# Altium footprint library 2016AbbasBasereh9365731239.PcbLib: 204 footprints (part 12 of 13)
Each footprint in its own frame and in the unit in brackets; x right, y up, seen from the top. Pads: shape width x height; smd on the part's side, far side on the other; paste and mask are expansions set on the pad; w line width, h text height; cw(c..) or ccw(c..) is an arc to the next point about the centre after c.
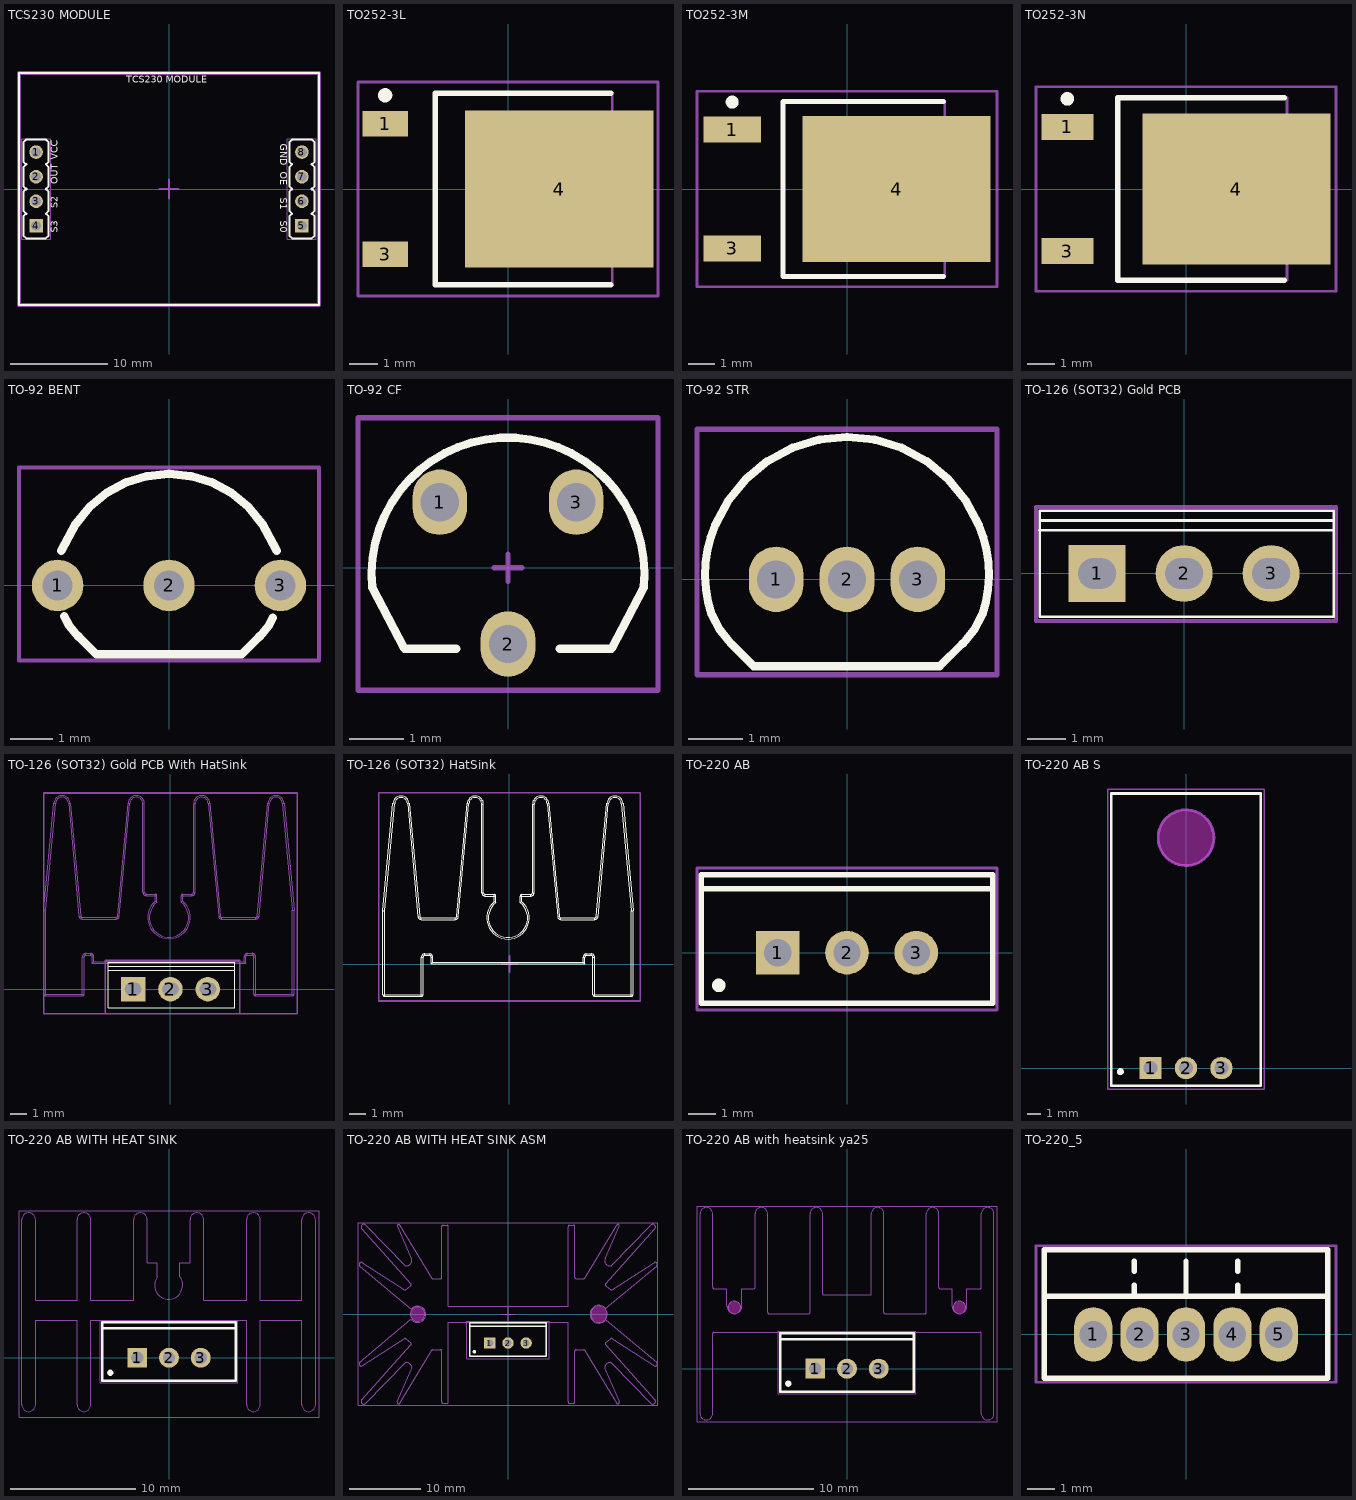
[diagram p11: the footprints below, top view; thin cyan lines are the x and y axes]

## TCS230 MODULE [mm] "DESIGNER ABBAS BASEREH"
height 1.4
pads (8):
  round 1.4 / inner round 1.4 / far side oval 2.2x1.4 hole 1 mask+0.1: 1(-13.737,3.81) 2(-13.737,1.27) 3(-13.737,-1.27) 6(13.738,-1.27) 7(13.738,1.27) 8(13.738,3.81)
  rect 1.4x1.4 / inner rect 1.4x1.4 / far side rect 2.2x1.4 hole 1 mask+0.1: 4(-13.737,-3.81) 5(13.738,-3.81)
Top Overlay:
  lines w0.2: -14.737,-2.57 -15.037,-2.27 -15.037,-0.27 -14.737,0.03 ; -14.737,-2.51 -15.037,-2.81 -15.037,-4.81 -14.737,-5.11 -12.737,-5.11 -12.437,-4.81 -12.437,-2.81 -12.737,-2.51 ; -14.737,-0.03 -15.037,0.27 -15.037,2.27 -14.737,2.57 ; -14.737,2.515 -15.037,2.815 -15.037,4.815 -14.737,5.115 -12.737,5.115 -12.437,4.815 -12.437,2.815 -12.737,2.515 ; -12.737,-2.57 -12.437,-2.27 -12.437,-0.27 -12.737,0.03 ; -12.737,-0.03 -12.437,0.27 -12.437,2.27 -12.737,2.57 ; 12.738,-2.57 12.438,-2.27 12.438,-0.27 12.738,0.03 ; 12.738,-2.51 12.438,-2.81 12.438,-4.81 12.738,-5.11 14.738,-5.11 15.038,-4.81 15.038,-2.81 14.738,-2.51 ; 12.738,-0.03 12.438,0.27 12.438,2.27 12.738,2.57 ; 12.738,2.515 12.438,2.815 12.438,4.815 12.738,5.115 14.738,5.115 15.038,4.815 15.038,2.815 14.738,2.515 ; 14.738,-2.57 15.038,-2.27 15.038,-0.27 14.738,0.03 ; 14.738,-0.03 15.038,0.27 15.038,2.27 14.738,2.57 ; -15.5,-12 -15.5,12 15.5,12 15.5,-12 -15.5,-12
  text "S0" at 11.5,-3.3 h0.7
  text "S1" at 11.5,-0.9 h0.7
  text "OE" at 11.5,1.8 h0.7
  text "GND" at 11.5,4.7 h0.7
  text "S3" at -11.5,-4.5 h0.7
  text "S2" at -11.5,-2 h0.7
  text "OUT" at -11.5,0.5 h0.7
  text "VCC" at -11.5,3 h0.7
  text "TCS230 MODULE" at -4.4,11 h0.7
Mechanical 15:
  lines w0.1: -15.237,-5.21 -12.237,-5.21 -12.237,5.215 -15.237,5.215 -15.237,-5.21 ; 12.238,-5.21 12.238,5.215 15.238,5.215 15.238,-5.21 12.238,-5.21
  lines w0.2: -1,0 1,0 ; 0,-1 0,1
  lines w0.4: -15.5,-12 -15.5,12 15.5,12 15.5,-12 -15.5,-12
3D body "User Library-Header_Male_4Pin.STEP": height 8.54, standoff -3, extent 12.468,-5.08 14.957,5.08
3D body "User Library-Header_Male_4Pin.STEP": height 8.54, standoff -3, extent -15.007,-5.08 -12.518,5.08

## TO252-3L [mm] "D-PAK, 3-Pads, Body 6.2x6.7mm (max), IPC High Density"
height 2.38
pads (3):
  rect 1.6x0.9 smd: 1(-4.3,2.28) 3(-4.3,-2.28)
  rect 6.6x5.5 smd: 4(1.8,0)
Top Overlay:
  circle w0.25: c-4.3,3.28 r0.125
  lines w0.2: 3.6,-3.35 -2.55,-3.35 -2.55,3.35 3.6,3.35
Mechanical 13:
  lines w0.1: -2.55,-3.35 -2.55,3.35 3.65,3.35 3.65,-3.35 -2.55,-3.35
Mechanical 15:
  lines w0.1: -0.5,0 0.5,0 ; 0,-0.5 0,0.5 ; -5.25,-3.75 -5.25,3.75 5.25,3.75 5.25,-3.75 -5.25,-3.75
3D body "User Library-DPAK-1.step": height 2.39, standoff -0.02, extent -5.061,-3.27 4.878,3.27

## TO252-3M [mm] "D-PAK, 3-Pads, Body 6.2x6.7mm (max), IPC Low Density"
height 2.38
pads (3):
  rect 2.2x1 smd: 1(-4.4,2.28) 3(-4.4,-2.28)
  rect 7.2x5.6 smd: 4(1.9,0)
Top Overlay:
  circle w0.25: c-4.4,3.33 r0.125
  lines w0.2: 3.7,-3.35 -2.45,-3.35 -2.45,3.35 3.7,3.35
Mechanical 13:
  lines w0.1: -2.45,-3.35 3.75,-3.35 3.75,3.35 -2.45,3.35 -2.45,-3.35
Mechanical 15:
  lines w0.1: -0.5,0 0.5,0 ; 0,-0.5 0,0.5 ; -5.75,-3.75 -5.75,3.75 5.75,3.75 5.75,-3.75 -5.75,-3.75
3D body "User Library-DPAK-1.step": height 2.39, standoff -0.02, extent -5.061,-3.27 4.878,3.27

## TO252-3N [mm] "D-PAK, 3-Pads, Body 6.2x6.7mm (max), IPC Medium Density"
height 2.38
pads (3):
  rect 1.9x0.95 smd: 1(-4.35,2.28) 3(-4.35,-2.28)
  rect 6.9x5.55 smd: 4(1.85,0)
Top Overlay:
  circle w0.25: c-4.35,3.305 r0.125
  lines w0.2: 3.6,-3.35 -2.5,-3.35 -2.5,3.35 3.6,3.35
Mechanical 13:
  lines w0.1: -2.5,-3.35 3.7,-3.35 3.7,3.35 -2.5,3.35 -2.5,-3.35
Mechanical 15:
  lines w0.1: -0.5,0 0.5,0 ; 0,-0.5 0,0.5 ; -5.5,-3.75 5.5,-3.75 5.5,3.75 -5.5,3.75 -5.5,-3.75
3D body "User Library-DPAK-1.step": height 2.39, standoff -0.02, extent -5.061,-3.27 4.878,3.27

## TO-92 BENT [mm] "DESIGNER :ABBAS BASEREH"
height 8
pads (3):
  round 1.2 hole 0.7: 1(-2.6,0) 2(0,0) 3(2.6,0)
Top Overlay:
  lines w0.2: -2.512,0.806 -2.173,1.441 -1.848,1.837 -1.452,2.162 -1,2.403 -0.51,2.552 0,2.602 0.51,2.552 1,2.403 1.452,2.162 1.848,1.837 2.173,1.441 2.512,0.806 ; -2.443,-0.723 -2.326,-0.941 -2.118,-1.195 -2.112,-1.189 -1.7,-1.601 1.7,-1.601 2.112,-1.189 2.118,-1.195 2.326,-0.941 2.424,-0.759
Mechanical 15:
  lines w0.1: -3.5,-1.75 3.5,-1.75 3.5,2.75 -3.5,2.75 -3.5,-1.75
3D body "User Library-TO-92_Bent.STEP": height 10, standoff -3, extent -2.79,-1.59 2.79,2.613

## TO-92 CF [mm] "DESIGNER :ABBAS BASEREH"
height 8.5
pads (3):
  oval 1x1.2 hole 0.7: 1(-1.25,1.2) 2(0,-1.4) 3(1.25,1.2)
Top Overlay:
  lines w0.15: -0.95,-1.485 -1.9,-1.485 -2.487,-0.365 cw(c0,-0.115) 2.487,-0.365 1.9,-1.485 0.95,-1.485
Mechanical 15:
  lines w0.1: -0.25,0 0.25,0 ; 0,-0.25 0,0.25 ; -2.75,-2.25 2.75,-2.25 2.75,2.75 -2.75,2.75 -2.75,-2.25
3D body "User Library-TO-92_CF127SB127.STEP": height 8.5, standoff -4, extent -2.5,-1.57 2.5,2.4

## TO-92 STR [mm] "DESIGNER :ABBAS BASEREH"
height 7
pads (3):
  oval 1x1.2 hole 0.7 mask+0.06: 1(-1.3,0) 2(0,0) 3(1.3,0)
Top Overlay:
  lines w0.15: -2.481,-0.642 cw(c-0.325,0.092) -2.414,0.999 -2.173,1.45 -1.848,1.846 -1.452,2.171 -1,2.413 -0.51,2.562 0,2.612 0.51,2.562 1,2.413 1.452,2.171 1.848,1.846 2.173,1.45 2.414,0.999 cw(c0.325,0.092) 2.481,-0.642 2.326,-0.931 2.118,-1.185 2.112,-1.18 1.7,-1.592 -1.712,-1.592 -2.118,-1.185 -2.326,-0.931 -2.481,-0.642
Mechanical 15:
  lines w0.1: -2.75,-1.75 2.75,-1.75 2.75,2.75 -2.75,2.75 -2.75,-1.75
3D body "User Library-TO-92_Str.STEP": height 10, standoff -3, extent -2.613,-1.591 2.613,2.613

## TO-126 (SOT32) Gold PCB [mm] "Design:Abbas Basereh"
height 16
pads (3):
  rect 1.5x1.5 hole 0.8 slot 1 at 0 deg: 1(-2.29,0)
  round 1.5 hole 0.8 slot 1 at 0 deg: 2(0,0) 3(2.29,0)
Top Overlay:
  lines w0.07: -3.81,1.143 3.937,1.143 3.937,1.651 ; -3.8,1.397 3.937,1.397 ; 3.937,1.651 -3.8,1.651 -3.8,-1.143 3.937,-1.143 3.937,1.651
Mechanical 15:
  lines w0.1: -3.9,-1.25 -3.9,1.75 4,1.75 4,-1.25 -3.9,-1.25
3D body "User Library-TO-126 (SOT32) Gold PCB.STEP": height 13.19, standoff -3.54, extent -3.8,-1 3.8,1.55

## TO-126 (SOT32) Gold PCB With HatSink [mm] "Design:Abbas Basereh"
height 16
pads (3):
  rect 1.5x1.5 hole 0.8 slot 1 at 0 deg: 1(-2.29,0)
  round 1.5 hole 0.8 slot 1 at 0 deg: 2(0,0) 3(2.29,0)
Top Overlay:
  lines w0.07: -3.81,1.143 3.937,1.143 3.937,1.651 ; -3.8,1.397 3.937,1.397 ; 3.937,1.651 -3.8,1.651 -3.8,-1.143 3.937,-1.143 3.937,1.651
Mechanical 1:
  lines w0.013: -7.74,-0.318 ccw(c-7.64,-0.318) -7.64,-0.418 ; -5.498,4.473 ccw(c-5.399,4.482) -5.399,4.382 ; -5.39,-0.418 ccw(c-5.39,-0.318) -5.29,-0.318 ; -5.29,1.982 cw(c-5.19,1.982) -5.19,2.082 ; -4.89,2.082 cw(c-4.89,1.982) -4.79,1.982 ; -3.327,4.382 ccw(c-3.327,4.482) -3.227,4.473 ; -1.59,5.919 ccw(c-1.49,5.919) -1.49,5.819 ; -0.94,5.819 cw(c-0.94,5.719) -0.84,5.719 ; 0.66,5.719 cw(c0.76,5.719) 0.76,5.819 ; 1.31,5.819 ccw(c1.31,5.919) 1.41,5.919 ; 3.047,4.473 ccw(c3.147,4.482) 3.147,4.382 ; 4.61,1.982 cw(c4.71,1.982) 4.71,2.082 ; 5.01,2.082 cw(c5.01,1.982) 5.11,1.982 ; 5.11,-0.318 ccw(c5.21,-0.318) 5.21,-0.418 ; 5.219,4.382 ccw(c5.219,4.482) 5.318,4.473 ; 7.46,-0.418 ccw(c7.46,-0.318) 7.56,-0.318
  lines w0.05: -7.74,4.832 -7.74,-0.318 -7.64,-0.318 ; -7.74,4.832 -7.64,4.827 ; -7.74,4.832 -7.133,11.388 ; -7.64,-0.318 -5.39,-0.318 ; -7.64,-0.318 -7.64,4.827 ; -7.64,-0.318 -7.64,-0.418 -5.39,-0.418 -5.39,-0.318 ; -7.64,4.827 -7.034,11.379 ; -7.133,11.388 cw(c-6.636,11.342) -6.138,11.388 ; -7.133,11.388 -7.034,11.379 ; -7.034,11.379 cw(c-6.636,11.342) -6.237,11.379 ; -6.237,11.379 -5.598,4.464 ; -6.237,11.379 -6.138,11.388 ; -6.138,11.388 -5.498,4.473 -5.598,4.464 ; -5.598,4.464 ccw(c-5.399,4.482) -5.399,4.282 ; -5.399,4.282 -3.327,4.282 ; -5.399,4.282 -5.399,4.382 -3.327,4.382 -3.327,4.282 ; -5.39,-0.318 -5.39,1.982 ; -5.39,-0.318 -5.29,-0.318 -5.29,1.982 -5.39,1.982 ; -5.39,1.982 cw(c-5.19,1.982) -5.19,2.182 ; -5.19,2.182 -4.89,2.182 ; -5.19,2.182 -5.19,2.082 -4.89,2.082 -4.89,2.182 ; -4.89,2.182 cw(c-4.89,1.982) -4.69,1.982 ; -4.79,1.582 4.61,1.582 ; -4.79,1.582 -4.69,1.682 ; -4.79,1.582 -4.79,1.982 -4.69,1.982 ; -4.69,1.682 4.51,1.682 ; -4.69,1.682 -4.69,1.982 ; -3.327,4.282 ccw(c-3.327,4.482) -3.128,4.464 ; -3.128,4.464 -2.488,11.379 ; -3.128,4.464 -3.227,4.473 -2.588,11.388 ; -2.588,11.388 cw(c-2.09,11.342) -1.59,11.342 ; -2.588,11.388 -2.488,11.379 ; -2.488,11.379 cw(c-2.09,11.342) -1.69,11.342 ; -1.69,5.919 ccw(c-1.49,5.919) -1.49,5.719 ; -1.69,5.919 -1.69,11.342 ; -1.69,5.919 -1.59,5.919 -1.59,11.342 ; -1.69,11.342 -1.59,11.342 ; -1.49,5.719 -0.94,5.719 ; -1.49,5.719 -1.49,5.819 -0.94,5.819 -0.94,5.719 ; -0.94,5.366 cw(c-3.387,0.015) -0.84,5.319 ; -0.94,5.366 ccw(c-0.09,4.382) 0.76,5.366 ; -0.94,5.366 -0.94,5.719 ; -0.94,5.719 -0.84,5.719 -0.84,5.319 ; -0.84,5.319 ccw(c-0.09,4.382) 0.66,5.319 ; 0.66,5.319 cw(c3.206,0.015) 0.76,5.366 ; 0.66,5.319 0.66,5.719 0.76,5.719 ; 0.76,5.366 0.76,5.719 ; 0.76,5.719 1.31,5.719 ; 0.76,5.719 0.76,5.819 1.31,5.819 1.31,5.719 ; 1.31,5.719 ccw(c1.31,5.919) 1.51,5.919 ; 1.41,11.342 cw(c1.91,11.342) 2.408,11.388 ; 1.41,11.342 1.41,5.919 1.51,5.919 ; 1.41,11.342 1.51,11.342 ; 1.51,5.919 1.51,11.342 ; 1.51,11.342 cw(c1.91,11.342) 2.308,11.379 ; 2.308,11.379 2.947,4.464 ; 2.308,11.379 2.408,11.388 ; 2.408,11.388 3.047,4.473 2.947,4.464 ; 2.947,4.464 ccw(c3.147,4.482) 3.147,4.282 ; 3.147,4.282 5.219,4.282 ; 3.147,4.282 3.147,4.382 5.219,4.382 5.219,4.282 ; 4.51,1.682 4.61,1.582 ; 4.51,1.682 4.51,1.982 ; 4.51,1.982 cw(c4.71,1.982) 4.71,2.182 ; 4.51,1.982 4.61,1.982 4.61,1.582 ; 4.71,2.182 5.01,2.182 ; 4.71,2.182 4.71,2.082 5.01,2.082 5.01,2.182 ; 5.01,2.182 cw(c5.01,1.982) 5.21,1.982 ; 5.21,-0.318 7.46,-0.318 ; 5.21,-0.318 5.21,1.982 ; 5.21,-0.318 5.21,-0.418 7.46,-0.418 7.46,-0.318 ; 5.21,-0.318 5.11,-0.318 5.11,1.982 5.21,1.982 ; 5.219,4.282 ccw(c5.219,4.482) 5.418,4.464 ; 5.418,4.464 6.057,11.379 ; 5.418,4.464 5.318,4.473 5.958,11.388 ; 5.958,11.388 cw(c6.455,11.342) 6.953,11.388 ; 5.958,11.388 6.057,11.379 ; 6.057,11.379 cw(c6.455,11.342) 6.854,11.379 ; 6.854,11.379 7.46,4.827 ; 6.854,11.379 6.953,11.388 ; 6.953,11.388 7.56,4.832 ; 7.46,-0.318 7.56,-0.318 7.56,4.832 ; 7.46,-0.318 7.46,4.827 ; 7.46,4.827 7.56,4.832
Mechanical 15:
  lines w0.1: -4,-1.5 -4,1.75 4.25,1.75 4.25,-1.5 ; -7.75,-1.5 -7.75,12 7.75,12 7.75,-1.5 -7.75,-1.5
3D body "User Library-TO-126 (SOT32) Gold PCB.STEP": height 13.19, standoff -3.54, extent -3.8,-1 3.8,1.55
3D body "User Library-Heatsink-57AS.STEP": height 26.5, standoff 1.5, extent -7.68,-0.381 7.62,11.878

## TO-126 (SOT32) HatSink [mm] "Design:Abbas Basereh"
Top Overlay:
  lines w0.013: -7.74,-1.868 ccw(c-7.64,-1.868) -7.64,-1.968 ; -7.74,-1.868 -7.74,3.282 ; -7.74,-1.868 -7.64,-1.868 ; -7.74,3.282 -7.64,3.277 ; -7.74,3.282 -7.133,9.838 ; -7.64,-1.968 -5.39,-1.968 ; -7.64,-1.968 -7.64,-1.868 ; -7.64,-1.868 -5.39,-1.868 ; -7.64,-1.868 -7.64,3.277 ; -7.64,3.277 -7.034,9.829 ; -7.133,9.838 cw(c-6.636,9.792) -6.138,9.838 ; -7.133,9.838 -7.034,9.829 ; -7.034,9.829 cw(c-6.636,9.792) -6.237,9.829 ; -6.237,9.829 -5.598,2.914 ; -6.237,9.829 -6.138,9.838 ; -6.138,9.838 -5.498,2.923 ; -5.598,2.914 ccw(c-5.399,2.932) -5.399,2.732 ; -5.598,2.914 -5.498,2.923 ; -5.498,2.923 ccw(c-5.399,2.932) -5.399,2.832 ; -5.399,2.732 -3.327,2.732 ; -5.399,2.732 -5.399,2.832 ; -5.399,2.832 -3.327,2.832 ; -5.39,-1.968 ccw(c-5.39,-1.868) -5.29,-1.868 ; -5.39,-1.968 -5.39,-1.868 ; -5.39,-1.868 -5.39,0.432 ; -5.39,-1.868 -5.29,-1.868 ; -5.39,0.432 cw(c-5.19,0.432) -5.19,0.632 ; -5.39,0.432 -5.29,0.432 ; -5.29,-1.868 -5.29,0.432 ; -5.29,0.432 cw(c-5.19,0.432) -5.19,0.532 ; -5.19,0.532 -4.89,0.532 ; -5.19,0.532 -5.19,0.632 ; -5.19,0.632 -4.89,0.632 ; -4.89,0.532 cw(c-4.89,0.432) -4.79,0.432 ; -4.89,0.532 -4.89,0.632 ; -4.89,0.632 cw(c-4.89,0.432) -4.69,0.432 ; -4.79,0.032 4.61,0.032 ; -4.79,0.032 -4.69,0.132 ; -4.79,0.032 -4.79,0.432 ; -4.79,0.432 -4.69,0.432 ; -4.69,0.132 4.51,0.132 ; -4.69,0.132 -4.69,0.432 ; -3.327,2.732 ccw(c-3.327,2.932) -3.128,2.914 ; -3.327,2.732 -3.327,2.832 ; -3.327,2.832 ccw(c-3.327,2.932) -3.227,2.923 ; -3.227,2.923 -2.588,9.838 ; -3.227,2.923 -3.128,2.914 ; -3.128,2.914 -2.488,9.829 ; -2.588,9.838 cw(c-2.09,9.792) -1.59,9.792 ; -2.588,9.838 -2.488,9.829 ; -2.488,9.829 cw(c-2.09,9.792) -1.69,9.792 ; -1.69,4.369 ccw(c-1.49,4.369) -1.49,4.169 ; -1.69,4.369 -1.69,9.792 ; -1.69,4.369 -1.59,4.369 ; -1.69,9.792 -1.59,9.792 ; -1.59,4.369 ccw(c-1.49,4.369) -1.49,4.269 ; -1.59,4.369 -1.59,9.792 ; -1.49,4.169 -0.94,4.169 ; -1.49,4.169 -1.49,4.269 ; -1.49,4.269 -0.94,4.269 ; -0.94,3.816 cw(c-3.386,-1.535) -0.84,3.769 ; -0.94,3.816 ccw(c-0.09,2.832) 0.76,3.816 ; -0.94,3.816 -0.94,4.169 ; -0.94,4.169 -0.94,4.269 ; -0.94,4.169 -0.84,4.169 ; -0.94,4.269 cw(c-0.94,4.169) -0.84,4.169 ; -0.84,3.769 ccw(c-0.09,2.832) 0.66,3.769 ; -0.84,3.769 -0.84,4.169 ; 0.66,3.769 cw(c3.206,-1.535) 0.76,3.816 ; 0.66,3.769 0.66,4.169 ; 0.66,4.169 cw(c0.76,4.169) 0.76,4.269 ; 0.66,4.169 0.76,4.169 ; 0.76,3.816 0.76,4.169 ; 0.76,4.169 1.31,4.169 ; 0.76,4.169 0.76,4.269 ; 0.76,4.269 1.31,4.269 ; 1.31,4.169 ccw(c1.31,4.369) 1.51,4.369 ; 1.31,4.169 1.31,4.269 ; 1.31,4.269 ccw(c1.31,4.369) 1.41,4.369 ; 1.41,4.369 1.41,9.792 ; 1.41,4.369 1.51,4.369 ; 1.41,9.792 cw(c1.91,9.792) 2.408,9.838 ; 1.41,9.792 1.51,9.792 ; 1.51,4.369 1.51,9.792 ; 1.51,9.792 cw(c1.91,9.792) 2.308,9.829 ; 2.308,9.829 2.948,2.914 ; 2.308,9.829 2.408,9.838 ; 2.408,9.838 3.047,2.923 ; 2.948,2.914 ccw(c3.147,2.932) 3.147,2.732 ; 2.948,2.914 3.047,2.923 ; 3.047,2.923 ccw(c3.147,2.932) 3.147,2.832 ; 3.147,2.732 5.219,2.732 ; 3.147,2.732 3.147,2.832 ; 3.147,2.832 5.219,2.832 ; 4.51,0.132 4.61,0.032 ; 4.51,0.132 4.51,0.432 ; 4.51,0.432 cw(c4.71,0.432) 4.71,0.632 ; 4.51,0.432 4.61,0.432 ; 4.61,0.032 4.61,0.432 ; 4.61,0.432 cw(c4.71,0.432) 4.71,0.532 ; 4.71,0.532 5.01,0.532 ; 4.71,0.532 4.71,0.632 ; 4.71,0.632 5.01,0.632 ; 5.01,0.532 cw(c5.01,0.432) 5.11,0.432 ; 5.01,0.532 5.01,0.632 ; 5.01,0.632 cw(c5.01,0.432) 5.21,0.432 ; 5.11,-1.868 ccw(c5.21,-1.868) 5.21,-1.968 ; 5.11,-1.868 5.11,0.432 ; 5.11,-1.868 5.21,-1.868 ; 5.11,0.432 5.21,0.432 ; 5.21,-1.968 7.46,-1.968 ; 5.21,-1.968 5.21,-1.868 ; 5.21,-1.868 7.46,-1.868 ; 5.21,-1.868 5.21,0.432 ; 5.219,2.732 ccw(c5.219,2.932) 5.418,2.914 ; 5.219,2.732 5.219,2.832 ; 5.219,2.832 ccw(c5.219,2.932) 5.318,2.923 ; 5.318,2.923 5.958,9.838 ; 5.318,2.923 5.418,2.914 ; 5.418,2.914 6.057,9.829 ; 5.958,9.838 cw(c6.455,9.792) 6.953,9.838 ; 5.958,9.838 6.057,9.829 ; 6.057,9.829 cw(c6.455,9.792) 6.854,9.829 ; 6.854,9.829 7.46,3.277 ; 6.854,9.829 6.953,9.838 ; 6.953,9.838 7.56,3.282 ; 7.46,-1.968 ccw(c7.46,-1.868) 7.56,-1.868 ; 7.46,-1.968 7.46,-1.868 ; 7.46,-1.868 7.56,-1.868 ; 7.46,-1.868 7.46,3.277 ; 7.46,3.277 7.56,3.282 ; 7.56,-1.868 7.56,3.282
Mechanical 15:
  lines w0.1: -0.5,0 0.5,0 ; 0,-0.5 0,0.5 ; -8,-2.25 -8,10.5 8,10.5 8,-2.25 -8,-2.25
3D body "User Library-Heatsink-57AS.STEP": height 25, standoff 0, extent -7.65,-1.905 7.65,10.354

## TO-220 AB [mm] "Epoxy meets UL94, V0-Design:Abbas Basereh"
height 17
pads (3):
  rect 1.6x1.6 hole 1: 1(-2.54,0)
  round 1.6 hole 1: 2(0,0) 3(2.54,0)
Top Overlay:
  circle w0.25: c-4.7,-1.2 r0.125
  lines w0.2: -5.35,2.35 5.35,2.35 ; -5.35,-1.85 -5.35,2.85 5.35,2.85 5.35,-1.85 -5.35,-1.85
Mechanical 13:
  lines w0.1: -5.35,-1.85 5.35,-1.85 5.35,2.85 -5.35,2.85 -5.35,-1.85
Mechanical 15:
  lines w0.1: -0.5,0 0.5,0 ; 0,-0.5 0,0.5 ; -5.5,-2.1 5.5,-2.1 5.5,3.1 -5.5,3.1 -5.5,-2.1
3D body "SW3DPS-TO-220HS-DEFAULT.STEP": height 18.54, standoff -3.81, extent -5.08,-1.651 5.08,2.921

## TO-220 AB S [mm] "Epoxy meets UL94, V0-Design:Abbas Basereh"
height 17
pads (3):
  rect 1.6x1.6 hole 1: 1(-2.54,0)
  round 1.6 hole 1: 2(0,0) 3(2.54,0)
Top Overlay:
  circle w0.25: c-4.699,-0.254 r0.125
  lines w0.2: -5.35,-1.27 5.35,-1.27 5.35,19.685 -5.35,19.685 -5.35,-1.27
Keep-Out Layer:
  board cut-out: -2,16.5 -2,16.697 -1.923,17.083 -1.772,17.447 -1.553,17.775 -1.275,18.053 -0.947,18.272 -0.583,18.423 -0.197,18.5 0.197,18.5 0.583,18.423 0.947,18.272 1.275,18.053 1.553,17.775 1.772,17.447 1.923,17.083 2,16.697 2,16.5 1.999,16.303 1.922,15.917 1.771,15.554 1.552,15.226 1.274,14.948 0.946,14.729 0.583,14.578 0.197,14.5 0,14.5 -0.197,14.5 -0.583,14.577 -0.947,14.728 -1.275,14.947 -1.554,15.225 -1.772,15.553 -1.923,15.917 -2,16.303
Mechanical 1:
  circle w0.2: c0,16.51 r2
Mechanical 13:
  lines w0.1: -5.35,-1.27 -5.35,19.685 5.35,19.685 5.35,-1.27 -5.35,-1.27
Mechanical 15:
  lines w0.1: -0.5,0 0.5,0 ; 0,-0.5 0,0.5 ; -5.6,-1.5 5.6,-1.5 5.6,20 -5.6,20 -5.6,-1.5
3D body "SW3DPS-TO-220-DEFAULT.STEP": height 4.2, standoff -3, extent -5.08,0 5.08,19.49

## TO-220 AB WITH HEAT SINK [mm] "Epoxy meets UL94, V0-Design:Abbas Basereh"
height 17
pads (3):
  rect 1.6x1.6 hole 1: 1(-2.54,0)
  round 1.6 hole 1: 2(0,0) 3(2.54,0)
Top Overlay:
  circle w0.25: c-4.7,-1.2 r0.125
  lines w0.2: -5.35,2.35 5.35,2.35 ; -5.35,-1.85 -5.35,2.85 5.35,2.85 5.35,-1.85 -5.35,-1.85
Mechanical 1:
  lines w0.1: -6.029,2.996 5.971,2.996 ; -11.779,-3.754 ccw(c-11.229,-3.754) -10.679,-3.754 -10.679,2.996 -7.359,2.996 -7.359,-3.754 ccw(c-6.809,-3.754) -6.259,-3.754 -6.259,2.996 6.201,2.996 6.201,-3.754 ccw(c6.751,-3.754) 7.301,-3.754 7.301,2.996 10.621,2.996 10.621,-3.754 ccw(c11.171,-3.754) 11.721,-3.754 11.721,11.046 ccw(c11.171,11.046) 10.621,11.046 10.621,4.596 7.301,4.596 7.301,11.046 ccw(c6.751,11.046) 6.201,11.046 6.201,4.596 2.781,4.596 2.781,11.046 ccw(c2.231,11.046) 1.681,11.046 1.681,7.596 0.871,7.596 0.871,6.471 cw(c-0.029,5.796) -0.929,6.471 -0.929,7.596 -1.739,7.596 -1.739,11.046 ccw(c-2.289,11.046) -2.839,11.046 -2.839,4.596 -6.259,4.596 -6.259,11.046 ccw(c-6.809,11.046) -7.359,11.046 -7.359,4.596 -10.679,4.596 -10.679,11.046 ccw(c-11.229,11.046) -11.779,11.046 -11.779,-3.754
Mechanical 13:
  lines w0.1: -5.35,-1.85 5.35,-1.85 5.35,2.85 -5.35,2.85 -5.35,-1.85
Mechanical 15:
  lines w0.1: -0.5,0 0.5,0 ; 0,-0.5 0,0.5 ; -12,-4.75 12,-4.75 12,11.75 -12,11.75 -12,-4.75 ; -5.5,-2 -5.5,3 5.5,3 5.5,-2 -5.5,-2
3D body "User Library-to-220_heatsink_asm.STEP": height 25, standoff -5.48, extent -11.75,-4.6 11.75,11.3

## TO-220 AB WITH HEAT SINK ASM [mm] "-Design:Abbas Basereh"
pads (3):
  rect 1.6x1.6 hole 1: 1(-2.54,-4.064)
  round 1.6 hole 1: 2(0,-4.064) 3(2.54,-4.064)
Top Overlay:
  circle w0.25: c-4.7,-5.264 r0.125
  lines w0.2: -5.35,-1.714 5.35,-1.714 ; -5.35,-5.914 5.35,-5.914 5.35,-1.214 -5.35,-1.214 -5.35,-5.914
Keep-Out Layer:
  board cut-out: -11.663,-0.029 -11.659,0.068 -11.688,0.259 -11.754,0.44 -11.854,0.606 -11.985,0.748 -12.141,0.863 -12.316,0.945 -12.503,0.991 -12.6,0.995 -12.8,0.995 -12.893,0.99 -13.075,0.945 -13.243,0.865 -13.393,0.753 -13.519,0.615 -13.615,0.454 -13.677,0.278 -13.705,0.093 -13.7,0 -13.7,-0.098 -13.662,-0.292 -13.586,-0.474 -13.477,-0.637 -13.337,-0.777 -13.174,-0.886 -12.992,-0.962 -12.798,-1 -12.7,-1 -12.6,-1 -12.508,-1 -12.327,-0.964 -12.156,-0.893 -12.003,-0.791 -11.872,-0.66 -11.77,-0.507 -11.699,-0.336 -11.663,-0.155 -11.663,-0.063
  board cut-out: 13.887,-0.029 13.889,0.08 13.851,0.295 13.771,0.498 13.653,0.682 13.502,0.839 13.322,0.964 13.122,1.051 12.909,1.098 12.8,1.1 12.6,1.1 12.497,1.092 12.297,1.037 12.112,0.943 11.948,0.815 11.813,0.658 11.711,0.477 11.647,0.28 11.622,0.075 11.629,-0.029 11.629,-0.14 11.673,-0.358 11.758,-0.564 11.881,-0.749 12.039,-0.906 12.223,-1.029 12.429,-1.114 12.647,-1.158 12.758,-1.158 12.8,-1.158 12.909,-1.156 13.122,-1.109 13.322,-1.022 13.502,-0.897 13.653,-0.74 13.771,-0.556 13.851,-0.353 13.889,-0.138
Mechanical 1:
  circle w0.013: c12.737,-0.029 r1.15
  circle w0.013: c-12.663,-0.029 r1
  lines w0.1: -13.589,-0.762 -20.735,-6.764 ccw(c-20.543,-6.994) -20.38,-7.246 -14.529,-3.45 cw(c-14.42,-3.617) -14.292,-3.464 -13.616,-4.027 cw(c-13.745,-4.181) -13.596,-4.314 -20.482,-11.986 ccw(c-20.199,-12.24) -19.927,-12.507 -14.354,-6.827 cw(c-14.189,-7.519) -13.535,-7.802 -15.485,-12.313 ccw(c-15.301,-12.392) -15.13,-12.495 -10.676,-5.096 cw(c-10.505,-5.199) -10.505,-4.999 -9.469,-4.999 cw(c-9.469,-5.199) -9.269,-5.199 -9.269,-12.302 ccw(c-9.069,-12.302) -9.069,-12.502 -8.531,-12.502 ccw(c-8.531,-12.302) -8.331,-12.302 -8.331,-1.174 8.405,-1.174 8.405,-12.302 ccw(c8.605,-12.302) 8.605,-12.502 9.143,-12.502 ccw(c9.143,-12.302) 9.343,-12.302 9.343,-5.199 cw(c9.543,-5.199) 9.543,-4.999 10.579,-4.999 cw(c10.579,-5.199) 10.75,-5.096 15.204,-12.495 ccw(c15.376,-12.392) 15.559,-12.313 13.61,-7.802 cw(c14.263,-7.519) 14.428,-6.827 20.002,-12.507 ccw(c20.273,-12.24) 20.556,-11.986 13.67,-4.314 cw(c13.819,-4.181) 13.691,-4.027 14.366,-3.464 cw(c14.494,-3.617) 14.603,-3.45 20.454,-7.246 ccw(c20.617,-6.994) 20.809,-6.764 13.697,-0.83 cw(c12.737,-0.029) 13.697,0.772 20.809,6.706 ccw(c20.617,6.936) 20.454,7.188 14.603,3.392 cw(c14.494,3.56) 14.366,3.406 13.691,3.969 cw(c13.819,4.123) 13.67,4.257 20.556,11.928 ccw(c20.273,12.182) 20.002,12.449 14.429,6.769 cw(c14.263,7.461) 13.61,7.744 15.559,12.255 ccw(c15.376,12.334) 15.204,12.437 10.75,5.038 cw(c10.579,5.141) 10.579,4.941 9.543,4.941 cw(c9.543,5.141) 9.343,5.141 9.343,12.244 ccw(c9.143,12.244) 9.143,12.444 8.605,12.444 ccw(c8.605,12.244) 8.405,12.244 8.405,1.116 -8.331,1.116 -8.331,12.244 ccw(c-8.531,12.244) -8.531,12.444 -9.069,12.444 ccw(c-9.069,12.244) -9.269,12.244 -9.269,5.141 cw(c-9.469,5.141) -9.469,4.941 -10.505,4.941 cw(c-10.505,5.141) -10.676,5.038 -15.13,12.437 ccw(c-15.301,12.334) -15.485,12.255 -13.535,7.744 cw(c-14.189,7.461) -14.354,6.769 -19.927,12.449 ccw(c-20.199,12.182) -20.482,11.928 -13.596,4.257 cw(c-13.745,4.123) -13.616,3.969 -14.292,3.406 cw(c-14.42,3.56) -14.529,3.392 -20.38,7.188 ccw(c-20.543,6.936) -20.735,6.706 -13.535,0.699 ; -13.565,-0.743 ccw(c-12.663,-0.029) -13.547,0.706
Mechanical 13:
  lines w0.1: -5.35,-5.914 -5.35,-1.214 5.35,-1.214 5.35,-5.914 -5.35,-5.914
Mechanical 15:
  lines w0.1: -1,0 1,0 ; -0.5,-4.064 0.5,-4.064 ; 0,-4.564 0,-3.564 ; 0,-1 0,1 ; -21,-12.75 21,-12.75 21,12.75 -21,12.75 -21,-12.75 ; -5.75,-6.25 5.75,-6.25 5.75,-1 -5.75,-1 -5.75,-6.25
3D body "User Library-TO220_Heatsink.STEP": height 50.8, standoff -3.5, extent -20.88,-12.592 20.878,12.592
3D body "SW3DPS-TO-220HS-DEFAULT.STEP": height 21.04, standoff -1.31, extent -5.08,-5.842 5.08,-1.27

## TO-220 AB with heatsink ya25 [mm] "Epoxy meets UL94, V0-Design:Abbas Basereh"
height 17
pads (3):
  rect 1.6x1.6 hole 1: 1(-2.54,0)
  round 1.6 hole 1: 2(0,0) 3(2.54,0)
Top Overlay:
  circle w0.25: c-4.7,-1.2 r0.125
  lines w0.2: -5.35,2.35 5.35,2.35 ; -5.35,-1.85 -5.35,2.85 5.35,2.85 5.35,-1.85 -5.35,-1.85
Keep-Out Layer:
  board cut-out: 9.5,4.9 9.5,4.999 9.424,5.183 9.283,5.324 9.099,5.4 9,5.4 8.901,5.4 8.717,5.324 8.576,5.183 8.5,4.999 8.5,4.9 8.5,4.801 8.576,4.617 8.717,4.476 8.901,4.4 9,4.4 9.099,4.4 9.283,4.476 9.424,4.617 9.5,4.801 9.5,4.9
  board cut-out: -8.5,4.9 -8.5,4.999 -8.576,5.183 -8.717,5.324 -8.901,5.4 -9,5.4 -9.099,5.4 -9.283,5.324 -9.424,5.183 -9.5,4.999 -9.5,4.9 -9.5,4.801 -9.424,4.617 -9.283,4.476 -9.099,4.4 -9,4.4 -8.901,4.4 -8.717,4.476 -8.576,4.617 -8.5,4.801 -8.5,4.9
Mechanical 1:
  circle w0.1: c9,4.9 r0.5
  circle w0.1: c-9,4.9 r0.5
  lines w0.1: -11.75,-3.6 ccw(c-11.25,-3.6) -11.25,-4.1 ccw(c-11.25,-3.6) -10.75,-3.6 -10.75,2.8 cw(c-10.65,2.8) -10.65,2.9 10.65,2.9 cw(c10.65,2.8) 10.75,2.8 10.75,-3.6 ccw(c11.25,-3.6) 11.25,-4.1 ccw(c11.25,-3.6) 11.75,-3.6 11.75,12.4 ccw(c11.25,12.4) 11.25,12.9 ccw(c11.25,12.4) 10.75,12.4 10.75,6.5 cw(c10.65,6.5) 10.65,6.4 9.6,6.4 9.6,5 cw(c9,5) 9,4.4 cw(c9,5) 8.4,5 8.4,6.4 7.45,6.4 cw(c7.45,6.5) 7.35,6.5 7.35,12.4 ccw(c6.85,12.4) 6.85,12.9 ccw(c6.85,12.4) 6.35,12.4 6.35,4.5 cw(c6.25,4.5) 6.25,4.4 3.05,4.4 cw(c3.05,4.5) 2.95,4.5 2.95,12.4 ccw(c2.45,12.4) 2.45,12.9 ccw(c2.45,12.4) 1.95,12.4 1.95,6 cw(c1.85,6) 1.85,5.9 -1.85,5.9 cw(c-1.85,6) -1.95,6 -1.95,12.4 ccw(c-2.45,12.4) -2.45,12.9 ccw(c-2.45,12.4) -2.95,12.4 -2.95,4.5 cw(c-3.05,4.5) -3.05,4.4 -6.25,4.4 cw(c-6.25,4.5) -6.35,4.5 -6.35,12.4 ccw(c-6.85,12.4) -6.85,12.9 ccw(c-6.85,12.4) -7.35,12.4 -7.35,6.5 cw(c-7.45,6.5) -7.45,6.4 -8.4,6.4 -8.4,5 cw(c-9,5) -9,4.4 cw(c-9,5) -9.6,5 -9.6,6.4 -10.65,6.4 cw(c-10.65,6.5) -10.75,6.5 -10.75,12.4 ccw(c-11.25,12.4) -11.25,12.9 ccw(c-11.25,12.4) -11.75,12.4 -11.75,-3.6
Mechanical 13:
  lines w0.1: -5.35,-1.85 5.35,-1.85 5.35,2.85 -5.35,2.85 -5.35,-1.85
Mechanical 15:
  lines w0.1: -0.5,0 0.5,0 ; 0,-0.5 0,0.5 ; -12,-4.25 12,-4.25 12,13 -12,13 -12,-4.25 ; -5.5,-2 5.5,-2 5.5,3 -5.5,3 -5.5,-2
3D body "SW3DPS-TO-220HS-DEFAULT.STEP": height 21.04, standoff -1.31, extent -5.08,-1.651 5.08,2.921
3D body "User Library-YA25.STEP": height 25, standoff -4, extent -11.75,-4.078 11.75,12.922

## TO-220_5 [mm] "TO-220 STRAIGHT, T05A pitch: 1.7mm-Designer Abbas Basereh"
height 7.62
pads (5):
  oval 1.4x2 hole 1: 1(-3.4,0) 2(-1.7,0) 3(0,0) 4(1.7,0) 5(3.4,0)
Top Overlay:
  lines w0.2: -5.2,1.4 5.2,1.4 ; -1.905,1.424 -1.905,1.805 ; -1.905,2.313 -1.905,2.694 ; 0,1.424 0,2.694 ; 1.905,1.424 1.905,1.805 ; 1.905,2.313 1.905,2.694 ; -5.2,-1.6 -5.2,3.1 5.2,3.1 5.2,-1.6 -5.2,-1.6
Mechanical 15:
  lines w0.1: -5.5,-1.75 -5.5,3.25 5.5,3.25 5.5,-1.75 -5.5,-1.75
3D body "User Library-TO220-5T PCB.step": height 17.05, standoff -6.52, extent -5.06,-1.55 5.06,2.907